# Altium footprint library ARCOM_Chips.PcbLib: 185 footprints (part 12 of 12)
Each footprint in its own frame and in the unit in brackets; x right, y up, seen from the top. Pads: shape width x height; smd on the part's side, far side on the other; paste and mask are expansions set on the pad; w line width, h text height; cw(c..) or ccw(c..) is an arc to the next point about the centre after c.
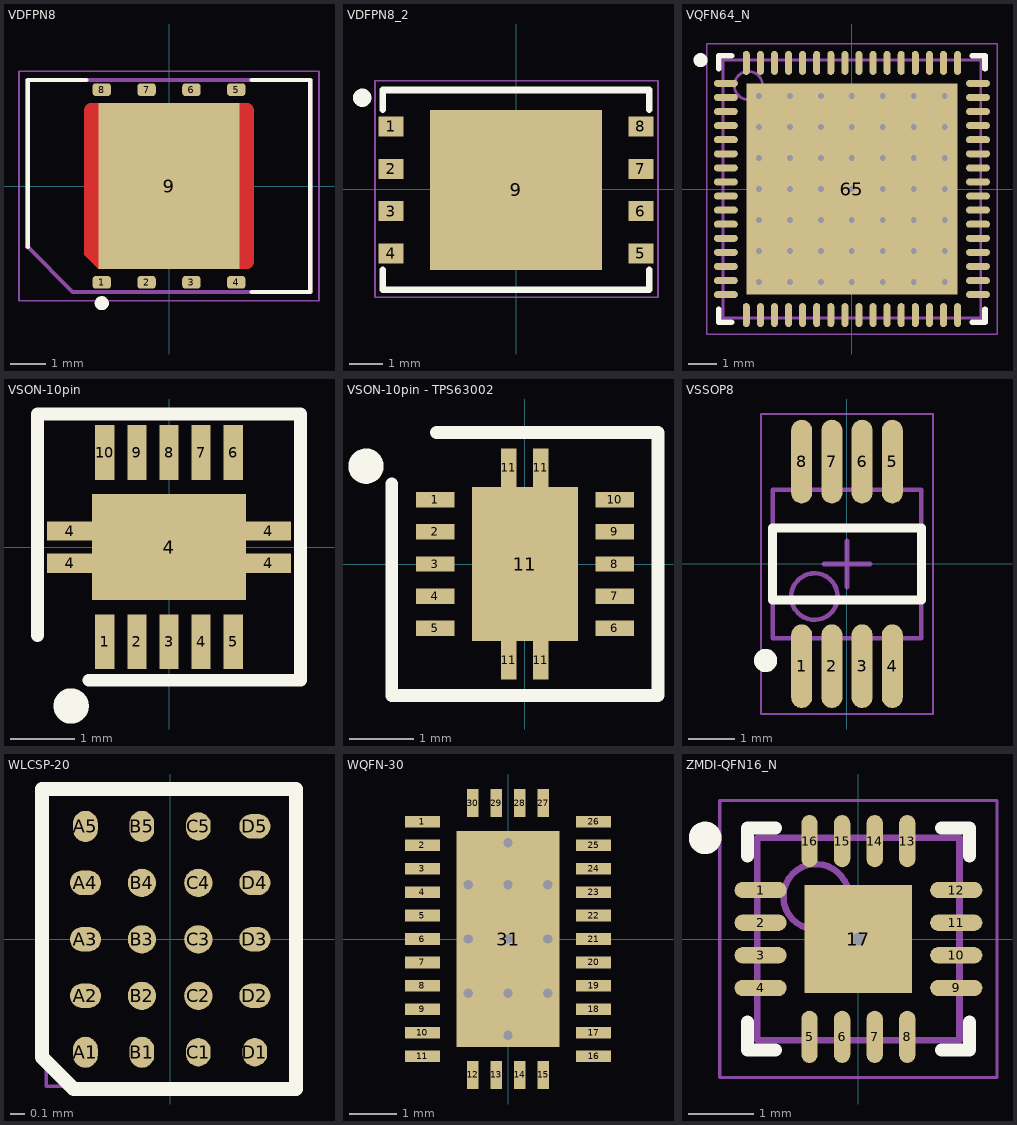
[diagram p11: the footprints below, top view; thin cyan lines are the x and y axes]

## VDFPN8 [mm] "BAD"
pads (9):
  rrect50% 0.52x0.36 smd: 1(-1.905,-2.73) 2(-0.635,-2.73) 3(0.635,-2.73) 4(1.905,-2.73) 5(1.905,2.73) 6(0.635,2.73) 7(-0.635,2.73) 8(-1.905,2.73)
  rect 4x4.7 smd paste-4.7 mask+0: 9(0,0)
Top Layer:
  region: 2.4,0 2.4,-2.15 2.398,-2.181 2.39,-2.212 2.378,-2.241 2.362,-2.268 2.341,-2.291 2.318,-2.312 2.291,-2.328 2.262,-2.34 2.231,-2.348 -2,-2.35 -2.4,-1.95 -2.4,2.15 -2.398,2.181 -2.39,2.212 -2.378,2.241 -2.362,2.268 -2.341,2.291 -2.318,2.312 -2.291,2.328 -2.262,2.34 -2.231,2.348 2.2,2.35 2.231,2.348 2.262,2.34 2.291,2.328 2.318,2.312 2.341,2.291 2.362,2.268 2.378,2.241 2.39,2.212 2.398,2.181 2.4,2.15
Top Overlay:
  circle w0.2: c-1.905,-3.32 r0.1
  lines w0.12: -4,-1.73 -4,3 -2.345,3 ; 2.345,-3 4,-3 4,3 2.345,3
Top Paste:
  region: -0.35,0.35 -2.05,0.35 -2.05,2 -0.35,2
  region: -0.35,-2 -2.05,-2 -2.05,-0.35 -0.35,-0.35
  region: 2.05,0.35 0.35,0.35 0.35,2 2.05,2
  region: 2.05,-2 0.35,-2 0.35,-0.35 2.05,-0.35
Top Solder:
  region: 2.4,0 2.4,-2.15 2.398,-2.181 2.39,-2.212 2.378,-2.241 2.362,-2.268 2.341,-2.291 2.318,-2.312 2.291,-2.328 2.262,-2.34 2.231,-2.348 -2,-2.35 -2.4,-1.95 -2.4,2.15 -2.398,2.181 -2.39,2.212 -2.378,2.241 -2.362,2.268 -2.341,2.291 -2.318,2.312 -2.291,2.328 -2.262,2.34 -2.231,2.348 2.2,2.35 2.231,2.348 2.262,2.34 2.291,2.328 2.318,2.312 2.341,2.291 2.362,2.268 2.378,2.241 2.39,2.212 2.398,2.181 2.4,2.15
Mechanical 11:
  lines w0.12: -4,-1.73 -4,3 4,3 4,-3 -2.73,-3 -4,-1.73
M15 Top Assy:
  circle w0.05: c0,0 r0.25
  lines w0.05: -0.35,0 0.35,0 ; 0,-0.35 0,0.35 ; -4.25,-3.25 -4.25,3.25 4.25,3.25 4.25,-3.25 -4.25,-3.25

## VDFPN8_2 [mm]
pads (9):
  rect 0.75x0.6 smd: 1(-3.762,1.877) 2(-3.762,0.607) 3(-3.762,-0.663) 4(-3.762,-1.933) 5(3.738,-1.933) 6(3.738,-0.663) 7(3.738,0.607) 8(3.738,1.877)
  rect 5.16x4.8 smd: 9(-0.012,-0.028)
Top Overlay:
  circle w0.3: c-4.634,2.74 r0.125
  lines w0.2: -4.012,-2.434 -4.012,-3.028 3.988,-3.028 3.988,-2.434 ; -4.012,2.377 -4.012,2.972 3.988,2.972 3.988,2.377
M15 Top Assy:
  lines w0.05: -4.25,-3.25 4.25,-3.25 4.25,3.25 -4.25,3.25 -4.25,-3.25

## VQFN64_N [mm] "QFN, 64-Leads, Body 9x9mm, Pitch 0.5mm, Thermal Pad 7.5x7.5mm, IPC Medium Density"
height 1
pads (65):
  oval 0.85x0.25 smd: 1(-4.475,3.75) 2(-4.475,3.25) 3(-4.475,2.75) 4(-4.475,2.25) 5(-4.475,1.75) 6(-4.475,1.25) 7(-4.475,0.75) 8(-4.475,0.25) 9(-4.475,-0.25) 10(-4.475,-0.75) 11(-4.475,-1.25) 12(-4.475,-1.75) 13(-4.475,-2.25) 14(-4.475,-2.75) 15(-4.475,-3.25) 16(-4.475,-3.75) 33(4.475,-3.75) 34(4.475,-3.25) 35(4.475,-2.75) 36(4.475,-2.25) 37(4.475,-1.75) 38(4.475,-1.25) 39(4.475,-0.75) 40(4.475,-0.25) 41(4.475,0.25) 42(4.475,0.75) 43(4.475,1.25) 44(4.475,1.75) 45(4.475,2.25) 46(4.475,2.75) 47(4.475,3.25) 48(4.475,3.75)
  oval 0.25x0.85 smd: 17(-3.75,-4.475) 18(-3.25,-4.475) 19(-2.75,-4.475) 20(-2.25,-4.475) 21(-1.75,-4.475) 22(-1.25,-4.475) 23(-0.75,-4.475) 24(-0.25,-4.475) 25(0.25,-4.475) 26(0.75,-4.475) 27(1.25,-4.475) 28(1.75,-4.475) 29(2.25,-4.475) 30(2.75,-4.475) 31(3.25,-4.475) 32(3.75,-4.475) 49(3.75,4.475) 50(3.25,4.475) 51(2.75,4.475) 52(2.25,4.475) 53(1.75,4.475) 54(1.25,4.475) 55(0.75,4.475) 56(0.25,4.475) 57(-0.25,4.475) 58(-0.75,4.475) 59(-1.25,4.475) 60(-1.75,4.475) 61(-2.25,4.475) 62(-2.75,4.475) 63(-3.25,4.475) 64(-3.75,4.475)
  rect 7.5x7.5 smd: 65(0,0)
via 3.3,-3.3 diameter 0.5 hole 0.2
via 2.2,-3.3 diameter 0.5 hole 0.2
via 1.1,-3.3 diameter 0.5 hole 0.2
via 0,-3.3 diameter 0.5 hole 0.2
via -1.1,-3.3 diameter 0.5 hole 0.2
via -2.2,-3.3 diameter 0.5 hole 0.2
via -3.3,-3.3 diameter 0.5 hole 0.2
via 3.3,-2.2 diameter 0.5 hole 0.2
via 2.2,-2.2 diameter 0.5 hole 0.2
via 1.1,-2.2 diameter 0.5 hole 0.2
via 0,-2.2 diameter 0.5 hole 0.2
via -1.1,-2.2 diameter 0.5 hole 0.2
via -2.2,-2.2 diameter 0.5 hole 0.2
via -3.3,-2.2 diameter 0.5 hole 0.2
via 3.3,-1.1 diameter 0.5 hole 0.2
via 2.2,-1.1 diameter 0.5 hole 0.2
via 1.1,-1.1 diameter 0.5 hole 0.2
via 0,-1.1 diameter 0.5 hole 0.2
via -1.1,-1.1 diameter 0.5 hole 0.2
via -2.2,-1.1 diameter 0.5 hole 0.2
via -3.3,-1.1 diameter 0.5 hole 0.2
via 3.3,0 diameter 0.5 hole 0.2
via 2.2,0 diameter 0.5 hole 0.2
via 1.1,0 diameter 0.5 hole 0.2
via 0,0 diameter 0.5 hole 0.2
via -1.1,0 diameter 0.5 hole 0.2
via -2.2,0 diameter 0.5 hole 0.2
via -3.3,0 diameter 0.5 hole 0.2
via 3.3,1.1 diameter 0.5 hole 0.2
via 2.2,1.1 diameter 0.5 hole 0.2
via 1.1,1.1 diameter 0.5 hole 0.2
via 0,1.1 diameter 0.5 hole 0.2
via -1.1,1.1 diameter 0.5 hole 0.2
via -2.2,1.1 diameter 0.5 hole 0.2
via -3.3,1.1 diameter 0.5 hole 0.2
via 3.3,2.2 diameter 0.5 hole 0.2
via 2.2,2.2 diameter 0.5 hole 0.2
via 1.1,2.2 diameter 0.5 hole 0.2
via 0,2.2 diameter 0.5 hole 0.2
via -1.1,2.2 diameter 0.5 hole 0.2
via -2.2,2.2 diameter 0.5 hole 0.2
via -3.3,2.2 diameter 0.5 hole 0.2
via 3.3,3.3 diameter 0.5 hole 0.2
via 2.2,3.3 diameter 0.5 hole 0.2
via 1.1,3.3 diameter 0.5 hole 0.2
via 0,3.3 diameter 0.5 hole 0.2
via -1.1,3.3 diameter 0.5 hole 0.2
via -2.2,3.3 diameter 0.5 hole 0.2
via -3.3,3.3 diameter 0.5 hole 0.2
Top Overlay:
  circle w0.25: c-5.375,4.575 r0.125
  lines w0.2: -4.725,-4.275 -4.725,-4.725 -4.275,-4.725 ; -4.725,4.275 -4.725,4.725 -4.275,4.725 ; 4.275,-4.725 4.725,-4.725 4.725,-4.275 ; 4.275,4.725 4.725,4.725 4.725,4.275
Mechanical 13:
  circle w0.1: c-3.675,3.675 r0.5
  lines w0.1: -4.575,-4.575 4.575,-4.575 4.575,4.575 -4.575,4.575 -4.575,-4.575
M15 Top Assy:
  lines w0.05: -5.15,-5.15 5.15,-5.15 5.15,5.15 -5.15,5.15 -5.15,-5.15
  lines w0.1: -0.5,0 0.5,0 ; 0,-0.5 0,0.5
3D body: height 1, standoff 0, extent -4.575,-4.575 4.575,4.575

## VSON-10pin [mm]
pads (15):
  rect 0.3x0.85 smd: 1(-1,-1.472) 2(-0.5,-1.472) 3(0,-1.472) 4(0.5,-1.472) 5(1,-1.472) 6(1,1.478) 7(0.5,1.478) 8(0,1.478) 9(-0.5,1.478) 10(-1,1.478)
  rect 0.7x0.3 smd: 4(-1.55,-0.247) 4(-1.55,0.253) 4(1.55,-0.247) 4(1.55,0.253)
  rect 2.4x1.65 smd: 4(0,0.003)
Top Overlay:
  circle w0.3: c-1.525,-2.472 r0.125
  lines w0.2: -2.05,-1.372 -2.05,2.078 2.05,2.078 2.05,-2.072 -1.25,-2.072

## VSON-10pin - TPS63002 [mm]
pads (15):
  rect 0.6x0.24 smd: 1(-1.4,1) 2(-1.4,0.5) 3(-1.4,0) 4(-1.4,-0.5) 5(-1.4,-1) 6(1.4,-1) 7(1.4,-0.5) 8(1.4,0) 9(1.4,0.5) 10(1.4,1)
  rect 0.24x0.6 smd: 11(-0.25,-1.5) 11(-0.25,1.5) 11(0.25,-1.5) 11(0.25,1.5)
  rect 1.65x2.4 smd: 11(0,0)
Top Overlay:
  circle w0.3: c-2.475,1.525 r0.125
  lines w0.2: -2.075,1.25 -2.075,-2.05 2.075,-2.05 2.075,2.05 -1.375,2.05
3D body "DRC0010J.stp": height 1, standoff 0, extent -1.5,-1.5 1.5,1.5

## VSSOP8 [mm]
pads (8):
  oval 0.45x1.8 smd mask+0.051: 1(-0.97,-2.2) 2(-0.32,-2.2) 3(0.33,-2.2) 4(0.98,-2.2) 5(0.98,2.2) 6(0.33,2.2) 7(-0.32,2.2) 8(-0.97,2.2)
Top Overlay:
  circle w0.25: c-1.745,-2.078 r0.125
  lines w0.2: -1.595,-0.778 -1.595,0.772 1.605,0.772 1.605,-0.778 -1.595,-0.778
Mechanical 13:
  circle w0.1: c-0.695,-0.703 r0.5
  lines w0.1: -1.595,-1.603 -1.595,1.597 1.605,1.597 1.605,-1.603 -1.595,-1.603
M15 Top Assy:
  lines w0.05: -1.845,-3.228 -1.845,3.222 1.855,3.222 1.855,-3.228 -1.845,-3.228
  lines w0.1: -0.495,-0.003 0.505,-0.003 ; 0.005,-0.503 0.005,0.497
3D body "User Library-VSSOP8 3x3 e0_65-1.STEP": height 1.1, standoff 0, extent -1.49,-2.492 1.51,2.508

## WLCSP-20 [mm]
pads (20):
  oval 0.175x0.22 smd: A1(-0.6,-0.8) A5(-0.6,0.8) B1(-0.2,-0.8) B5(-0.2,0.8)
  oval 0.22x0.175 smd: A2(-0.6,-0.4) A3(-0.6,0) A4(-0.6,0.4) D2(0.6,-0.4) D3(0.6,0) D4(0.6,0.4) D5(0.6,0.8)
  round 0.2 smd: B2(-0.2,-0.4) B3(-0.2,0) B4(-0.2,0.4) C2(0.2,-0.4) C3(0.2,0) C4(0.2,0.4)
  oval 0.175x0.2 smd: C1(0.2,-0.8) C5(0.2,0.8) D1(0.6,-0.8)
Top Overlay:
  lines w0.1: -0.908,-0.835 -0.683,-1.06 0.892,-1.06 0.892,1.065 -0.908,1.065 -0.908,-0.835
M15 Top Assy:
  lines w0.025: -0.876,-1.041 -0.876,1.041 0.876,1.041 0.876,-1.041 -0.876,-1.041
3D body "AD8233ACBZ-R7.stp": height 0.52, standoff -0.04, extent -0.853,-1.018 0.853,1.022

## WQFN-30 [mm]
pads (31):
  rect 0.75x0.25 smd mask+0.051: 1(-1.825,2.5) 2(-1.825,2) 3(-1.825,1.5) 4(-1.825,1) 5(-1.825,0.5) 6(-1.825,0) 7(-1.825,-0.5) 8(-1.825,-1) 9(-1.825,-1.5) 10(-1.825,-2) 11(-1.825,-2.5) 16(1.825,-2.5) 17(1.825,-2) 18(1.825,-1.5) 19(1.825,-1) 20(1.825,-0.5) 21(1.825,0) 22(1.825,0.5) 23(1.825,1) 24(1.825,1.5) 25(1.825,2) 26(1.825,2.5)
  rect 0.25x0.6 smd mask+0.051: 12(-0.75,-2.9) 13(-0.25,-2.9) 14(0.25,-2.9) 15(0.75,-2.9) 27(0.75,2.9) 28(0.25,2.9) 29(-0.25,2.9) 30(-0.75,2.9)
  rect 2.2x4.6 smd mask+0.051: 31(0,0)
via 0,-2.05 diameter 0.3 hole 0.2
via 0,2.05 diameter 0.3 hole 0.2
via -0.85,1.16 diameter 0.3 hole 0.2
via 0.85,-1.16 diameter 0.3 hole 0.2
via 0.85,1.16 diameter 0.3 hole 0.2
via 0,-1.16 diameter 0.3 hole 0.2
via -0.85,-1.16 diameter 0.3 hole 0.2
via -0.85,0 diameter 0.3 hole 0.2
via 0,1.16 diameter 0.3 hole 0.2
via 0.85,0 diameter 0.3 hole 0.2
via 0,0 diameter 0.3 hole 0.2
3D body "RNP0030A.stp": height 0.79, standoff -0.01, extent -2,-3 2,3

## ZMDI-QFN16_N [mm] "QFN, 16-Leads, Body 3.1x3.1mm, Pitch 0.5mm, Thermal Pad 1.65x1.65mm, IPC Medium Density"
height 1
pads (17):
  oval 0.8x0.25 smd: 1(-1.5,0.75) 2(-1.5,0.25) 3(-1.5,-0.25) 4(-1.5,-0.75) 9(1.5,-0.75) 10(1.5,-0.25) 11(1.5,0.25) 12(1.5,0.75)
  oval 0.25x0.8 smd: 5(-0.75,-1.5) 6(-0.25,-1.5) 7(0.25,-1.5) 8(0.75,-1.5) 13(0.75,1.5) 14(0.25,1.5) 15(-0.25,1.5) 16(-0.75,1.5)
  rect 1.65x1.65 smd: 17(0,0)
via 0,0 diameter 0.5 hole 0.2
Top Overlay:
  circle w0.25: c-2.35,1.55 r0.125
  lines w0.2: -1.7,-1.275 -1.7,-1.7 -1.275,-1.7 ; -1.7,1.275 -1.7,1.7 -1.275,1.7 ; 1.275,-1.7 1.7,-1.7 1.7,-1.275 ; 1.275,1.7 1.7,1.7 1.7,1.275
Mechanical 13:
  circle w0.1: c-0.65,0.65 r0.5
  lines w0.1: -1.55,-1.55 -1.55,1.55 1.55,1.55 1.55,-1.55 -1.55,-1.55
M15 Top Assy:
  lines w0.05: -2.125,-2.125 -2.125,2.125 2.125,2.125 2.125,-2.125 -2.125,-2.125
  lines w0.1: -0.5,0 0.5,0 ; 0,-0.5 0,0.5
3D body: height 1, standoff 0, extent -1.55,-1.55 1.55,1.55